# Altium integrated library vh_altium_library.intLib: 963 symbols (part 3 of 5) (continued)
## FDN5618
designator Q?
P-MOS; Reel: MAN; Supplier 1: Digi-Key; Supplier Part Number 1: FDN5618PTR-ND
footprint SOT23-GDS
pins: D, G, S

## FDS6912
designator Q?, comment FDS6912A
NMOS with Shottky diode in MicroFET 3x3mm; Supplier 1: Digi-Key; Supplier Part Number 1: FDS6912ACT-ND
footprint SO8
pins: 1, 2, 3, 4, 5, 6, 7, 8

## IRF640-TO220
designator Q?, comment IRF640
footprint TO220V-GDS
footprint TO220H-GDS
pins: D, G, S

## IRFR5505
designator Q?
P CHANNEL POWERMOS DPAK; Manufacturer: International Rectifier; Manufacturer Part Number: IRFR5505TRPBF; FET Feature: Standard; Current - Continuous Drain (Id) @ 25° C: 18A; Input Capacitance (Ciss) @ Vds: 650pF @ 25V; Gate Charge (Qg) @ Vgs: 32nC @ 10V; Drain to Source Voltage (Vdss): 55V; Power - Max: 57W; Vgs(th) (Max) @ Id: 4V @ 250µA; Rds On (Max) @ Id, Vgs: 110 mOhm @ 9.6A, 10V; FET Type: MOSFET P-Channel, Metal Oxide; Description: MOSFET P-CH 55V 18A DPAK; Supplier 1: Digi-Key; Supplier Part Number 1: IRFR5505PBFTR-ND; Mounting Type: Surface Mount; Packaging: Tape & Reel (TR); Package / Case: DPak, TO-252 (2 leads+tab), SC-63; Supplier: Digi-Key; Category: Discrete Semiconductor Products; Supplier Part Number: IRFR5505PBFTR-ND; RoHS: RoHS Compliant
footprint DPAK-GDS
pins: D, G, S

## IRLML2502
designator Q?
N CHANNEL MOSFET; Manufacturer Part Number: IRLML2502TRPBF; Manufacturer: International Rectifier; Drain to Source Voltage (Vdss): 20V; Gate Charge (Qg) @ Vgs: 12nC @ 5V; FET Feature: Logic Level Gate; Rds On (Max) @ Id, Vgs: 45 mOhm @ 4.2A, 4.5V; Vgs(th) (Max) @ Id: 1.2V @ 250µA; Current - Continuous Drain (Id) @ 25° C: 4.2A; Description: MOSFET N-CH 20V 4.2A SOT-23; Input Capacitance (Ciss) @ Vds: 740pF @ 15V; Power - Max: 1.25W; FET Type: MOSFET N-Channel, Metal Oxide; Supplier 1: Digi-Key; Supplier Part Number 1: IRLML2502PBFTR-ND; Category: Discrete Semiconductor Products; RoHS: RoHS Compliant; Mounting Type: Surface Mount; Package / Case: SOT-23-3, TO-236-3, Micro3™, SSD3, SST3; Packaging: Tape & Reel (TR); Supplier: Digi-Key; Supplier Part Number: IRLML2502PBFTR-ND
footprint SOT23-GDS
pins: D, G, S

## IRLML6401
designator Q?
N CHANNEL MOSFET; Manufacturer: International Rectifier; Manufacturer Part Number: IRLML6401TRPBF; Vgs(th) (Max) @ Id: 950mV @ 250µA; FET Feature: Logic Level Gate; Drain to Source Voltage (Vdss): 12V; Input Capacitance (Ciss) @ Vds: 830pF @ 10V; Current - Continuous Drain (Id) @ 25° C: 4.3A; Gate Charge (Qg) @ Vgs: 15nC @ 5V; FET Type: MOSFET P-Channel, Metal Oxide; Power - Max: 1.3W; Description: MOSFET P-CH 12V 4.3A SOT-23; Rds On (Max) @ Id, Vgs: 50 mOhm @ 4.3A, 4.5V; Reel: Q13; Supplier 1: Digi-Key; Supplier Part Number 1: IRLML6401PBFTR-ND; RoHS: RoHS Compliant; Packaging: Tape & Reel (TR); Supplier: Digi-Key; Supplier Part Number: IRLML6401PBFTR-ND; Mounting Type: Surface Mount; Category: Discrete Semiconductor Products; Package / Case: SOT-23-3, TO-236-3, Micro3™, SSD3, SST3
footprint SOT23-GDS
pins: D, G, S

## IRLML6402
designator Q?
N CHANNEL MOSFET; Manufacturer: International Rectifier; Manufacturer Part Number: IRLML6402TRPBF; Drain to Source Voltage (Vdss): 20V; Vgs(th) (Max) @ Id: 1.2V @ 250µA; Power - Max: 1.3W; FET Type: MOSFET P-Channel, Metal Oxide; Current - Continuous Drain (Id) @ 25° C: 3.7A; Description: MOSFET P-CH 20V 3.7A SOT-23; Input Capacitance (Ciss) @ Vds: 633pF @ 10V; FET Feature: Logic Level Gate; Rds On (Max) @ Id, Vgs: 65 mOhm @ 3.7A, 4.5V; Gate Charge (Qg) @ Vgs: 12nC @ 5V; REEL: Q15; Supplier 1: Digi-Key; Supplier Part Number 1: IRLML6402PBFTR-ND; Supplier Part Number: IRLML6402PBFTR-ND; Category: Discrete Semiconductor Products; RoHS: RoHS Compliant; Packaging: Tape & Reel (TR); Package / Case: SOT-23-3, TO-236-3, Micro3™, SSD3, SST3; Mounting Type: Surface Mount; Supplier: Digi-Key
footprint SOT23-GDS
pins: D, G, S

## MGSF2N02EL
designator Q?
N CHANNEL MOSFET 2N7002 SOT23; Supplier 1: Digi-Key; Supplier Part Number 1: MGSF2N02ELT1GOSCT-ND
footprint SOT23-GDS
pins: D, G, S

## MMBF4391
designator Q?
Supplier 1: Digi-Key; Supplier Part Number 1: MMBF4391LT1OSCT-ND
footprint SOT23-DSG (Footprint not found)
pins: D, G, S

## MMBF4392
designator Q?
Supplier 1: Digi-Key; Supplier 2: Digi-Key; Supplier Part Number 2: MMBF4392TR-ND
footprint SOT23-DSG (Footprint not found)
pins: D, G, S

## MMBF4393
designator Q?
Supplier 1: Digi-Key; Supplier 2: Digi-Key; Supplier Part Number 2: MMBF4393TR-ND
footprint SOT23-DSG (Footprint not found)
pins: D, G, S

## MMBT2222
designator Q?
BC847 SMALL SIGNAL NPN TRANSISTOR; Supplier 1: Digi-Key; Supplier Part Number 1: MMBT2222A-FDICT-ND
footprint SOT23-BCE
pins: B, C, E

## RFD16N05LSM
designator Q?
N CHANNEL MOSFET; Supplier 1: Digi-Key; Supplier Part Number 1: RFD16N05LSM9ACT-ND
footprint TO252AA-GDS
pins: D, G, S

## SI1023
designator Q?
DUAL P CHANNEL MOSFET
pins: 1, 2, 3, 4, 5, 6

## SI4630DY
designator Q2?
N VHANNEL MOSFET; Manufacturer Part Number: SI4630DY-T1-GE3; Manufacturer: Vishay/Siliconix; Description: MOSFET N-CH 25V 40A 8-SOIC; Supplier 1: Digi-Key; Supplier Part Number 1: SI4630DY-T1-GE3TR-ND
footprint SO8
pins: 1 S, 2 S, 3 S, 4 G, 5 D, 6 D, 7 D, 8 D

## SI5902
designator Q?
DUAL N CHANNEL MOSFET
footprint CHIPFET-1206X8 (CHIPFET 1206-8)
pins: 1 S1, 2 G1, 3 S2, 4 G2, 5 D2A, 6 D2B, 7 D1A, 8 D1B

## STF715
designator Q?
Manufacturer: STMicroelectronics; Frequency - Transition: 50MHz; Current - Collector Cutoff (Max): 1mA; Voltage - Collector Emitter Breakdown (Max): 80V; DC Current Gain (hFE) (Min) @ Ic, Vce: 40 @ 1A, 2V; Power - Max: 1.4W; Current - Collector (Ic) (Max): 1.5A; Vce Saturation (Max) @ Ib, Ic: 500mV @ 100mA, 1A; Transistor Type: NPN; Description: TRANSISTOR NPN MEDIUM PWR SOT89; Supplier 1: Digi-Key; Packaging: Tape & Reel (TR); Category: Discrete Semiconductor Products; Package / Case: SC-62, SOT-89-3, TO-243-3; RoHS: RoHS Compliant; Mounting Type: Surface Mount; Supplier: Digi-Key; Manufacturer Part Number: STF715; Supplier Part Number 1: 497-4656-2-ND; Supplier Part Number: 497-4656-2-ND
footprint SOT89-BCE
pins: B, C, E

## STF724
designator Q?
Manufacturer: STMicroelectronics; Transistor Type: NPN; Current - Collector Cutoff (Max): 100µA; Description: TRANSISTOR NPN MED POWER SOT-89; Voltage - Collector Emitter Breakdown (Max): 30V; Current - Collector (Ic) (Max): 3A; DC Current Gain (hFE) (Min) @ Ic, Vce: 100 @ 100mA, 2V; Power - Max: 1.4W; Frequency - Transition: 100MHz; Vce Saturation (Max) @ Ib, Ic: 1.1V @ 150mA, 3A; Reel: Q9; Supplier 1: Digi-Key; Supplier: Digi-Key; Manufacturer Part Number: STF724; Package / Case: SC-62, SOT-89-3, TO-243-3; Category: Discrete Semiconductor Products; Mounting Type: Surface Mount; Packaging: Tape & Reel (TR); RoHS: RoHS Compliant; Supplier Part Number 1: STF724-ND; Supplier Part Number: STF724-ND
footprint SOT89-BCE
pins: B, C, E

## STF817
designator Q?
Manufacturer Part Number: STF817A; Manufacturer: STMicroelectronics; Voltage - Collector Emitter Breakdown (Max): 80V; DC Current Gain (hFE) (Min) @ Ic, Vce: 30 @ 1A, 2V; Current - Collector (Ic) (Max): 1.5A; Vce Saturation (Max) @ Ib, Ic: 500mV @ 100mA, 1A; Current - Collector Cutoff (Max): 1mA; Transistor Type: PNP; Power - Max: 1.4W; Description: IC TRANS PWR PNP BIPO 30V SOT89; Frequency - Transition: 50MHz; Supplier 1: Digi-Key; RoHS: RoHS Compliant; Packaging: Tape & Reel (TR); Mounting Type: Surface Mount; Package / Case: SC-62, SOT-89-3, TO-243-3; Category: Discrete Semiconductor Products; Supplier: Digi-Key; Supplier Part Number 1: 497-4345-2-ND; Supplier Part Number: 497-4345-2-ND
footprint SOT89-BCE
pins: B, C, E


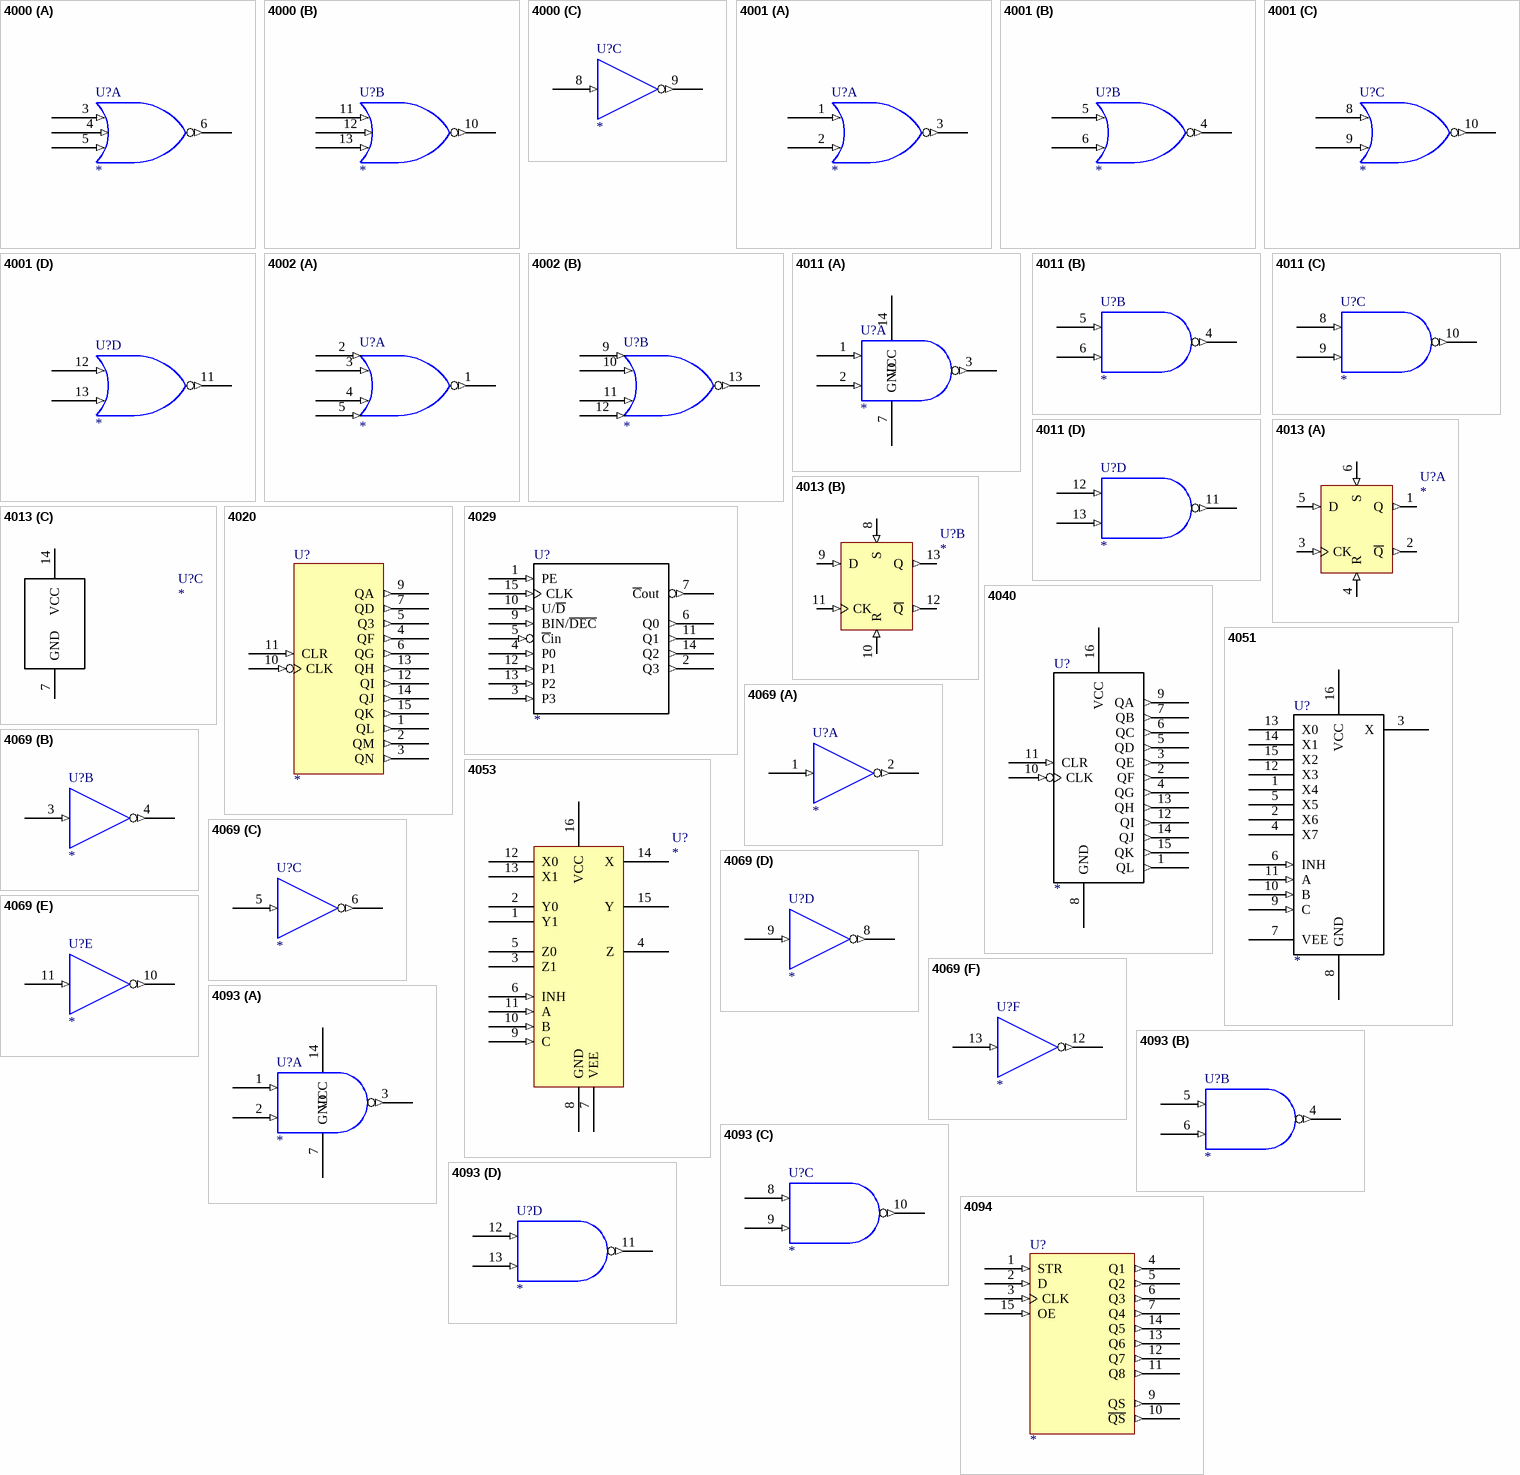
[diagram p31: symbols 4000 to 4094]

## 4000
designator U?
DUAL 3-INPUT NOR GATE PULSE INVERTER
footprint SO14
part A pins: 3 (in), 4 (in), 5 (in), 6 (out), 7 GND (power) hidden to GND, 14 VCC (power) hidden to VCC
part B pins: 10 (out), 11 (in), 12 (in), 13 (in)
part C pins: 8 (in), 9 (out)

## 4001
designator U?
Quad 2-INPUT NOR GATE
footprint SO14
part A pins: 1 (in), 2 (in), 3 (out), 7 GND (power) hidden to GND, 14 VCC (power) hidden to VCC
part B pins: 4 (out), 5 (in), 6 (in)
part C pins: 8 (in), 9 (in), 10 (out)
part D pins: 11 (out), 12 (in), 13 (in)

## 4002
designator U?
Dual 4-INPUT NOR GATE
footprint SO14
part A pins: 1 (out), 2 (in), 3 (in), 4 (in), 5 (in), 7 GND (power) hidden to GND, 14 VCC (power) hidden to VCC
part B pins: 9 (in), 10 (in), 11 (in), 12 (in), 13 (out)

## 4011
designator U?
Quad 2-INPUT Nand G
footprint SO14
part A pins: 1 (in), 2 (in), 3 (out), 7 GND (power), 14 VCC (power)
part B pins: 4 (out), 5 (in), 6 (in)
part C pins: 8 (in), 9 (in), 10 (out)
part D pins: 11 (out), 12 (in), 13 (in)

## 4013
designator U?
Dual D-Type Flip-Flop
footprint so14
part A pins: 1 Q (out), 2 ~{Q} (out), 3 CK (in), 4 R (in), 5 D (in), 6 S (in)
part B pins: 8 S (in), 9 D (in), 10 R (in), 11 CK (in), 12 ~{Q} (out), 13 Q (out)
part C pins: 7 GND, 14 VCC

## 4020
designator U?
14-BIT BINARY COUNTER
footprint SO16
pins: 1 QL (out), 2 QM (out), 3 QN (out), 4 QF (out), 5 Q3 (out), 6 QG (out), 7 QD (out), 8 GND (power) hidden to GND, 9 QA (out), 10 CLK (in), 11 CLR (in), 12 QI (out), 13 QH (out), 14 QJ (out), 15 QK (out), 16 VCC (power) hidden to VCC
1 alternate drawing of the same symbol

## 4029
designator U?
BINARY/DECADE UP/DOWN COUNTER
footprint so16
pins: 1 PE (in), 2 Q3 (out), 3 P3 (in), 4 P0 (in), 5 ~{C}in (in), 6 Q0 (out), 7 ~{C}out (out), 8 GND (power) hidden to GND, 9 BIN/~{DEC} (in), 10 U/~{D} (in), 11 Q1 (out), 12 P1 (in), 13 P2 (in), 14 Q2 (out), 15 CLK (in), 16 VCC (power) hidden to VCC
1 alternate drawing of the same symbol

## 4040
designator U?
ASYNCHRONOUS 12-BIT BINARY COUNTERS
footprint SO16
pins: 1 QL (out), 2 QF (out), 3 QE (out), 4 QG (out), 5 QD (out), 6 QC (out), 7 QB (out), 8 GND (power), 9 QA (out), 10 CLK (in), 11 CLR (in), 12 QI (out), 13 QH (out), 14 QJ (out), 15 QK (out), 16 VCC (power)
1 alternate drawing of the same symbol

## 4051
designator U?
footprint so16
pins: 1 X4, 2 X6, 3 X, 4 X7, 5 X5, 6 INH (in), 7 VEE, 8 GND (power), 9 C (in), 10 B (in), 11 A (in), 12 X3, 13 X0, 14 X1, 15 X2, 16 VCC (power)

## 4053
designator U?
footprint so16
pins: 1 Y1, 2 Y0, 3 Z1, 4 Z, 5 Z0, 6 INH (in), 7 VEE, 8 GND (power), 9 C (in), 10 B (in), 11 A (in), 12 X0, 13 X1, 14 X, 15 Y, 16 VCC (power)

## 4069
designator U?
HEX INVERTER
footprint SO14
part A pins: 1 (in), 2 (out), 7 GND (power) hidden to GND, 14 VCC (power) hidden to VCC
part B pins: 3 (in), 4 (out)
part C pins: 5 (in), 6 (out)
part D pins: 8 (out), 9 (in)
part E pins: 10 (out), 11 (in)
part F pins: 12 (out), 13 (in)

## 4093
designator U?
Quad 2-INPUT NAND SCHMITT TRIGGER
footprint SO14
part A pins: 1 (in), 2 (in), 3 (out), 7 GND (power), 14 VCC (power)
part B pins: 4 (out), 5 (in), 6 (in)
part C pins: 8 (in), 9 (in), 10 (out)
part D pins: 11 (out), 12 (in), 13 (in)

## 4094
designator U?
footprint SO16
pins: 1 STR (in), 2 D (in), 3 CLK (in), 4 Q1 (out), 5 Q2 (out), 6 Q3 (out), 7 Q4 (out), 8 GND (power) hidden to GND, 9 QS (out), 10 ~{QS} (out), 11 Q8 (out), 12 Q7 (out), 13 Q6 (out), 14 Q5 (out), 15 OE (in), 16 VCC (power) hidden to VCC


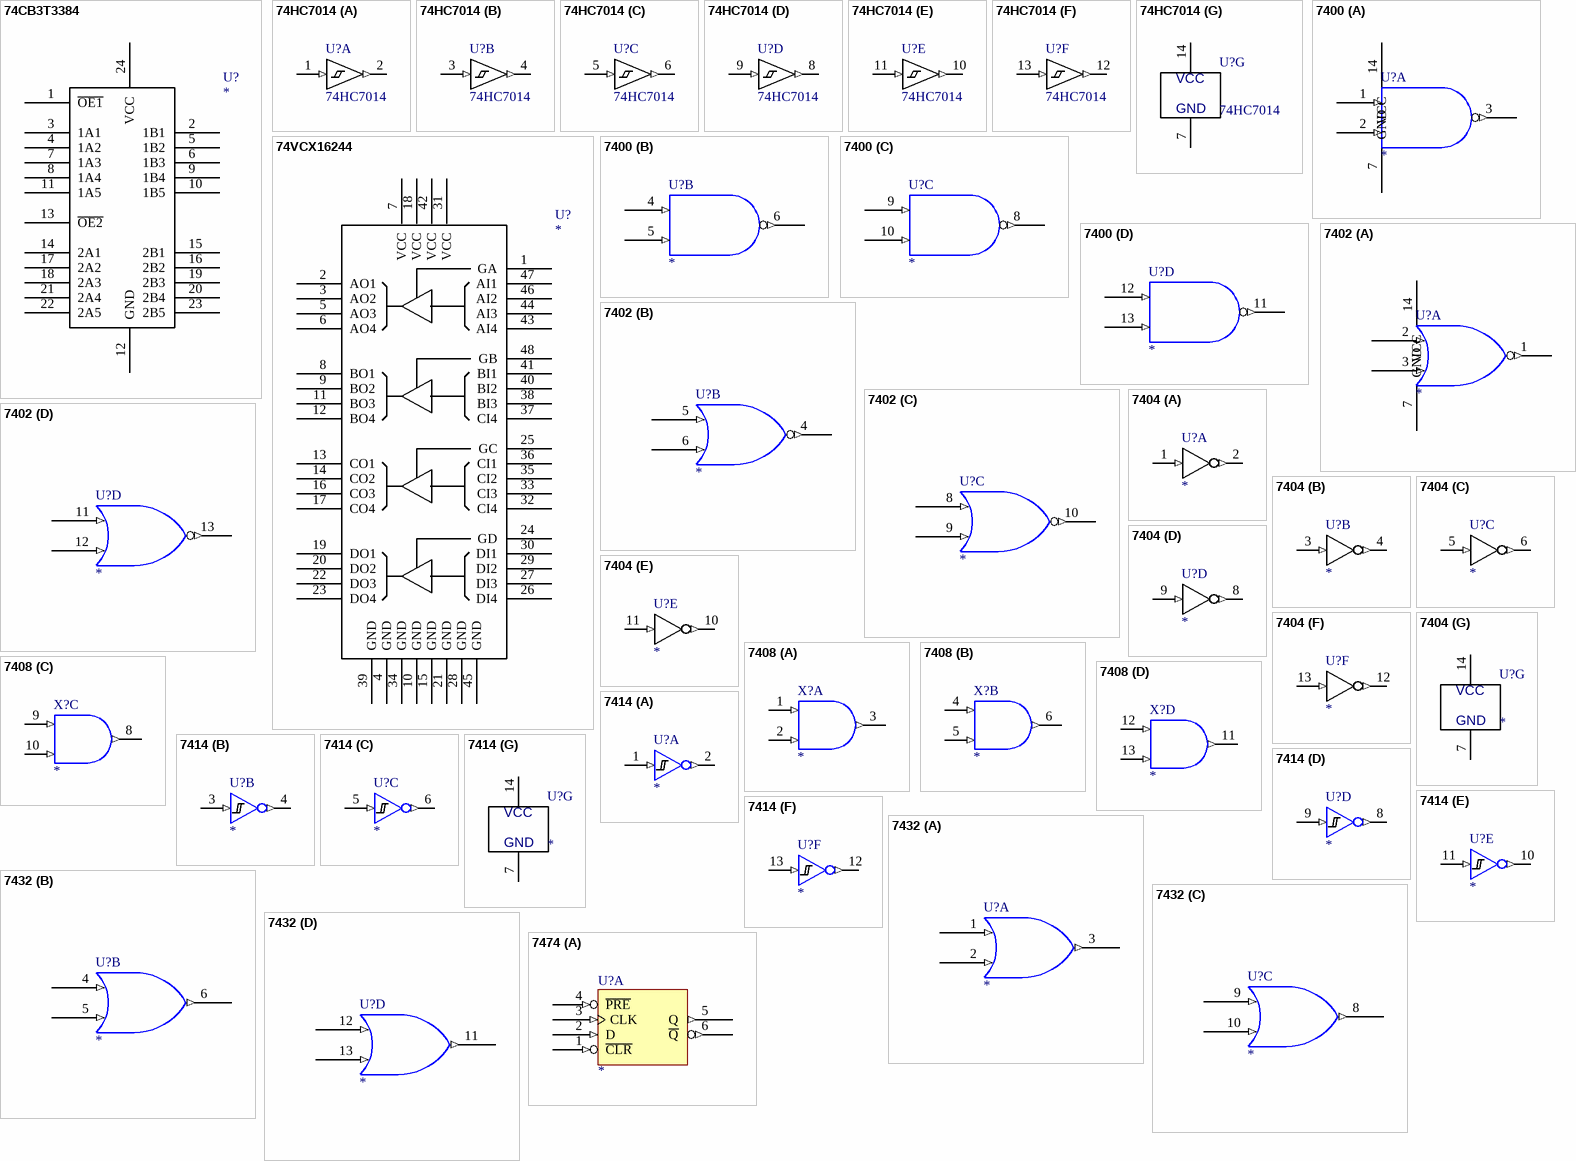
[diagram p32: symbols 74CB3T3384 to 7474]

## 74CB3T3384
designator U?
74CB3T3384 LEVEL SHIFTING BUFFER
footprint SO24W
pins: 1 ~{OE1}, 2 1B1, 3 1A1, 4 1A2, 5 1B2, 6 1B3, 7 1A3, 8 1A4, 9 1B4, 10 1B5, 11 1A5, 12 GND, 13 ~{OE2}, 14 2A1, 15 2B1, 16 2B2, 17 2A2, 18 2A3, 19 2B3, 20 2B4, 21 2A4, 22 2A5, 23 2B5, 24 VCC

## 74HC7014
designator U?
IC, Hex Schmitttrigger Buffer, SO-14
footprint SO14
part A pins: 1 A (in), 2 Y (out)
part B pins: 3 A (in), 4 Y (out)
part C pins: 5 A (in), 6 Y (out)
part D pins: 8 Y (out), 9 A (in)
part E pins: 10 Y (out), 11 A (in)
part F pins: 12 Y (out), 13 A (in)
part G pins: 7 GND, 14 VCC

## 74VCX16244
designator U?
footprint TSSOP48
pins: 1 GA, 2 AO1, 3 AO2, 4 GND, 5 AO3, 6 AO4, 7 VCC, 8 BO1, 9 BO2, 10 GND, 11 BO3, 12 BO4, 13 CO1, 14 CO2, 15 GND, 16 CO3, 17 CO4, 18 VCC, 19 DO1, 20 DO2, 21 GND, 22 DO3, 23 DO4, 24 GD, 25 GC, 26 DI4, 27 DI3, 28 GND, 29 DI2, 30 DI1, 31 VCC, 32 CI4, 33 CI3, 34 GND, 35 CI2, 36 CI1, 37 CI4, 38 BI3, 39 GND, 40 BI2, 41 BI1, 42 VCC, 43 AI4, 44 AI3, 45 GND, 46 AI2, 47 AI1, 48 GB

## 7400
designator U?
Quad 2-IN Pos Nand G
footprint SO14
part A pins: 1 (in), 2 (in), 3 (out), 7 GND (power), 14 VCC (power)
part B pins: 4 (in), 5 (in), 6 (out)
part C pins: 8 (out), 9 (in), 10 (in)
part D pins: 11 (out), 12 (in), 13 (in)

## 7402
designator U?
Quad 2-IN Pos Nor G
footprint SO14
part A pins: 1 (out), 2 (in), 3 (in), 7 GND (power), 14 VCC (power)
part B pins: 4 (out), 5 (in), 6 (in)
part C pins: 8 (in), 9 (in), 10 (out)
part D pins: 11 (in), 12 (in), 13 (out)

## 7404
designator U?
IC, M74HC04M, Hex Inverter, SO-14; Text Field1: ST; Text Field2: M74HC04M1R; Text Field3: Mouser; Text Field4: 511-M74HC04M; Text Field6: .22; Text Field5: SO-14; NI?: *; O?: *; Section:: *
footprint SO14
part A pins: 1 A (in), 2 Y (out)
part B pins: 3 A (in), 4 Y (out)
part C pins: 5 A (in), 6 Y (out)
part D pins: 8 Y (out), 9 A (in)
part E pins: 10 Y (out), 11 A (in)
part F pins: 12 Y (out), 13 A (in)
part G pins: 7 GND, 14 VCC

## 7408
designator X?
Quadruple 2-Input Positive-AND Gate
footprint SO14
part A pins: 1 A (in), 2 B (in), 3 Y (out), 7 GND (power) hidden to GND, 14 VCC (power) hidden to VCC
part B pins: 4 A (in), 5 B (in), 6 Y (out)
part C pins: 8 Y (out), 9 A (in), 10 B (in)
part D pins: 11 Y (out), 12 A (in), 13 B (in)

## 7414
designator U?
IC, M74HC04M, Hex Inverter, SO-14; Text Field1: ST; Text Field2: M74HC04M1R; Text Field3: Mouser; Text Field4: 511-M74HC04M; Text Field6: .22; Text Field5: SO-14; NI?: *; O?: *; Section:: *
footprint SO14
part A pins: 1 A (in), 2 Y (out)
part B pins: 3 A (in), 4 Y (out)
part C pins: 5 A (in), 6 Y (out)
part D pins: 8 Y (out), 9 A (in)
part E pins: 10 Y (out), 11 A (in)
part F pins: 12 Y (out), 13 A (in)
part G pins: 7 GND, 14 VCC

## 7432
designator U?
Quad 2-IN Pos Or G
footprint SO14
part A pins: 1 (in), 2 (in), 3 (out), 7 GND (power) hidden to GND, 14 VCC (power) hidden to VCC
part B pins: 4 (in), 5 (in), 6 (out)
part C pins: 8 (out), 9 (in), 10 (in)
part D pins: 11 (out), 12 (in), 13 (in)

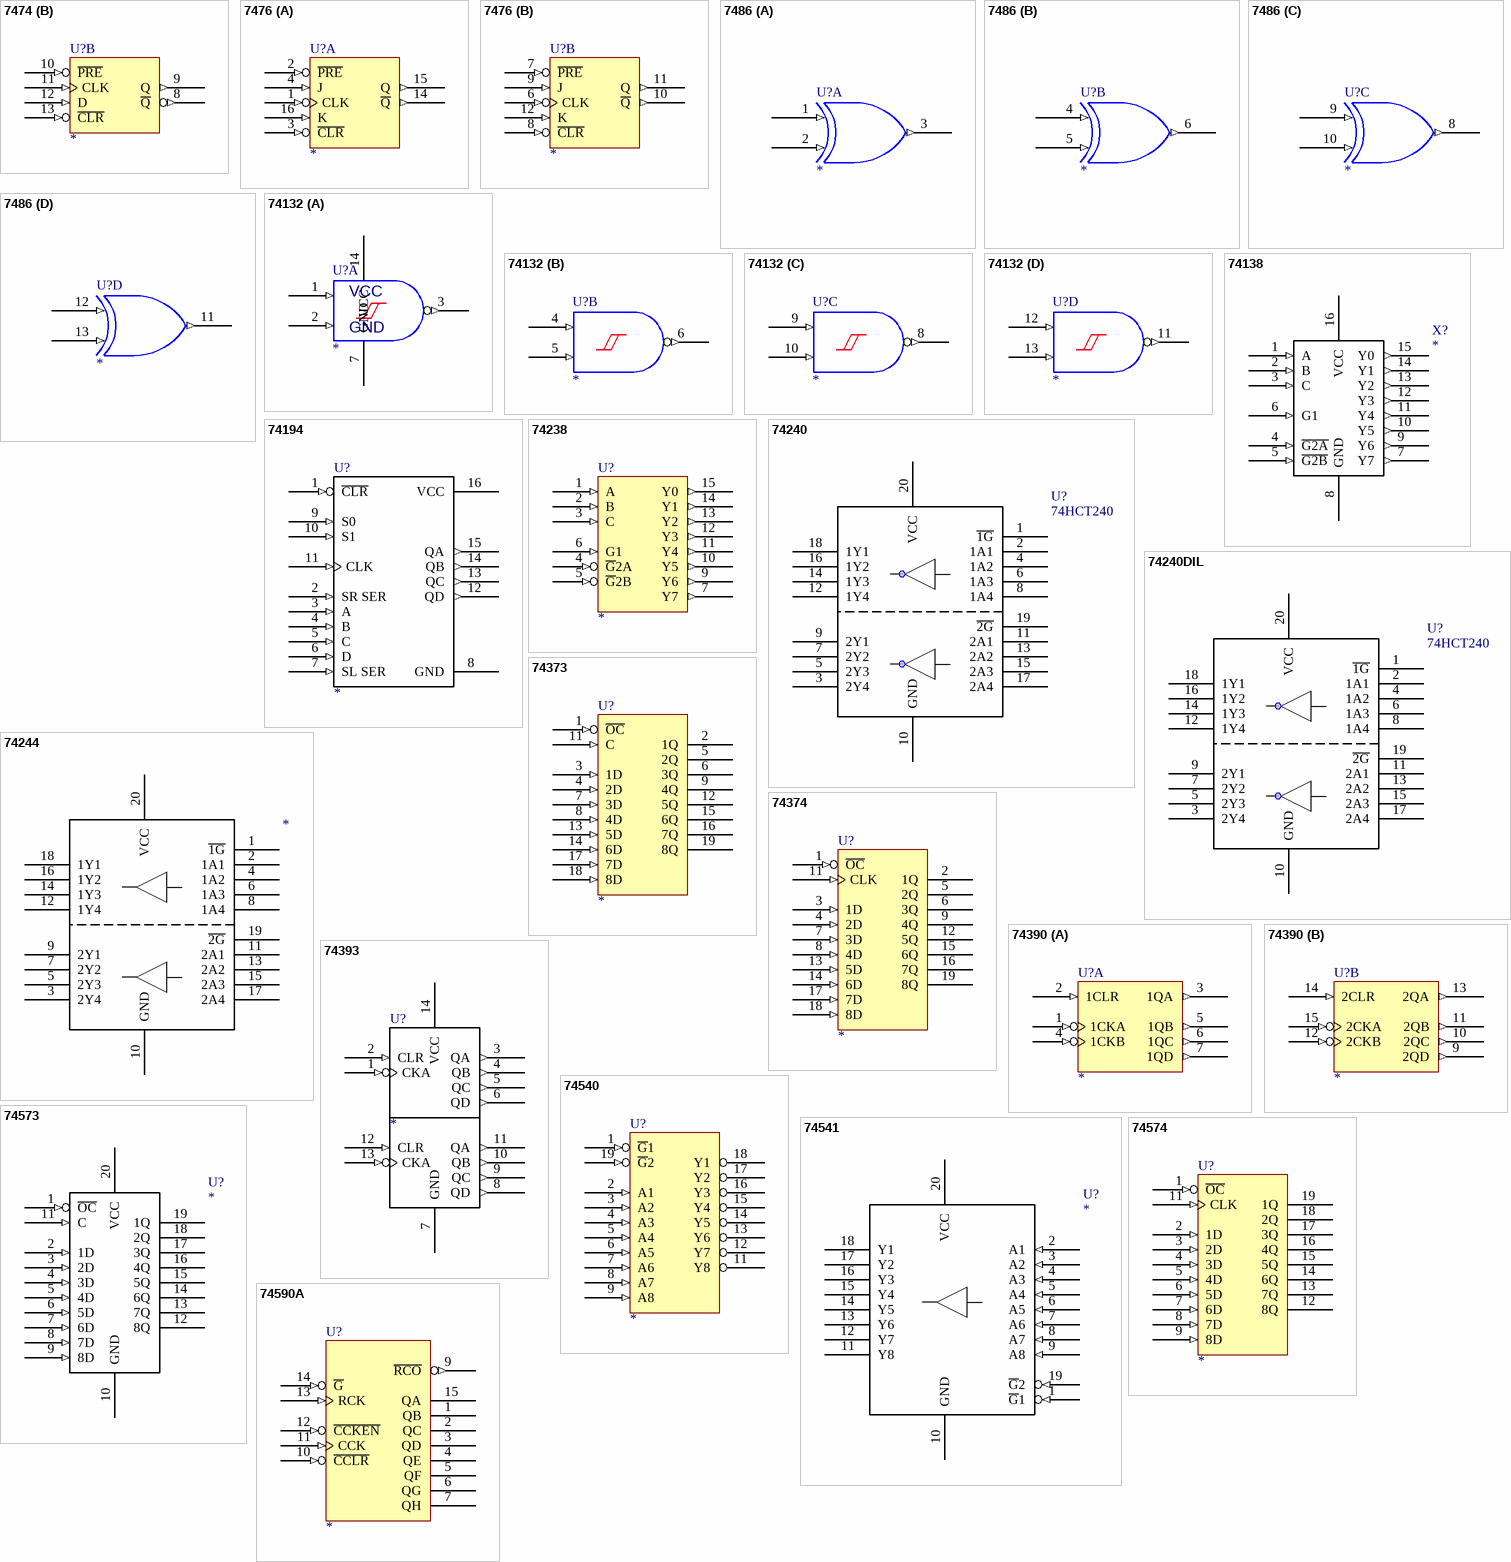
[diagram p33: symbols 7474 to 74590A]

## 7474
designator U?
DUAL D PET FF RS CR
footprint SO14
part A pins: 1 ~{CLR} (in), 2 D (in), 3 CLK (in), 4 ~{PRE} (in), 5 Q (out), 6 ~{Q} (out), 7 GND (power) hidden to GND, 14 VCC (power) hidden to VCC
part B pins: 8 ~{Q} (out), 9 Q (out), 10 ~{PRE} (in), 11 CLK (in), 12 D (in), 13 ~{CLR} (in)

## 7476
designator U?
DUAL J-K NET FF RS CR
footprint SO16
part A pins: 1 CLK (in), 2 ~{PRE} (in), 3 ~{CLR} (in), 4 J (in), 5 VCC (power) hidden to VCC, 13 GND (power) hidden to GND, 14 ~{Q} (out), 15 Q (out), 16 K (in)
part B pins: 6 CLK (in), 7 ~{PRE} (in), 8 ~{CLR} (in), 9 J (in), 10 ~{Q} (out), 11 Q (out), 12 K (in)

## 7486
designator U?
QUAD 2-IN XOR  G
footprint SO14
part A pins: 1 (in), 2 (in), 3 (out), 7 GND (power) hidden to GND, 14 VCC (power) hidden to VCC
part B pins: 4 (in), 5 (in), 6 (out)
part C pins: 8 (out), 9 (in), 10 (in)
part D pins: 11 (out), 12 (in), 13 (in)

## 74132
designator U?
QUAD 2-IN POS NAND SCH
footprint SO14
part A pins: 1 (in), 2 (in), 3 (out), 7 GND (power), 14 VCC (power)
part B pins: 4 (in), 5 (in), 6 (out)
part C pins: 8 (out), 9 (in), 10 (in)
part D pins: 11 (out), 12 (in), 13 (in)

## 74138
designator X?
3-Line to 8-Line Decoders/Demultiplexers
footprint SO16
pins: 1 A (in), 2 B (in), 3 C (in), 4 ~{G2A} (in), 5 ~{G2B} (in), 6 G1 (in), 7 Y7 (out), 8 GND (power), 9 Y6 (out), 10 Y5 (out), 11 Y4 (out), 12 Y3 (out), 13 Y2 (out), 14 Y1 (out), 15 Y0 (out), 16 VCC (power)

## 74194
designator U?
4-BIT BIDIRECTIONAL UNIVERSAL SFT REG
footprint SO16
pins: 1 ~{CLR} (in), 2 SR SER (in), 3 A (in), 4 B (in), 5 C (in), 6 D (in), 7 SL SER (in), 8 GND (power), 9 S0 (in), 10 S1 (in), 11 CLK (in), 12 QD (out), 13 QC (out), 14 QB (out), 15 QA (out), 16 VCC (power)
1 alternate drawing of the same symbol

## 74238
designator U?
3-8LINE DEC/DEMUL
footprint SO16
pins: 1 A (in), 2 B (in), 3 C (in), 4 ~{G}2A (in), 5 ~{G}2B (in), 6 G1 (in), 7 Y7 (out), 8 GND (power) hidden to GND, 9 Y6 (out), 10 Y5 (out), 11 Y4 (out), 12 Y3 (out), 13 Y2 (out), 14 Y1 (out), 15 Y0 (out), 16 VCC (power) hidden to VCC
1 alternate drawing of the same symbol

## 74240
designator U?, comment 74HCT240
74240
footprint SO20W
pins: 1 ~{1G}, 2 1A1, 3 2Y4, 4 1A2, 5 2Y3, 6 1A3, 7 2Y2, 8 1A4, 9 2Y1, 10 GND, 11 2A1, 12 1Y4, 13 2A2, 14 1Y3, 15 2A3, 16 1Y2, 17 2A4, 18 1Y1, 19 ~{2G}, 20 VCC

## 74240DIL
designator U?, comment 74HCT240
74240
footprint DIP20
pins: 1 ~{1G}, 2 1A1, 3 2Y4, 4 1A2, 5 2Y3, 6 1A3, 7 2Y2, 8 1A4, 9 2Y1, 10 GND, 11 2A1, 12 1Y4, 13 2A2, 14 1Y3, 15 2A3, 16 1Y2, 17 2A4, 18 1Y1, 19 ~{2G}, 20 VCC

## 74244
designator ?
footprint SO20W
pins: 1 ~{1G}, 2 1A1, 3 2Y4, 4 1A2, 5 2Y3, 6 1A3, 7 2Y2, 8 1A4, 9 2Y1, 10 GND, 11 2A1, 12 1Y4, 13 2A2, 14 1Y3, 15 2A3, 16 1Y2, 17 2A4, 18 1Y1, 19 ~{2G}, 20 VCC

## 74373
designator U?
OCTAL TRANSPARENT LCH
footprint SO20W
pins: 1 ~{OC} (in), 2 1Q (hiz), 3 1D (in), 4 2D (in), 5 2Q (hiz), 6 3Q (hiz), 7 3D (in), 8 4D (in), 9 4Q (hiz), 10 GND (power) hidden to GND, 11 C (in), 12 5Q (hiz), 13 5D (in), 14 6D (in), 15 6Q (hiz), 16 7Q (hiz), 17 7D (in), 18 8D (in), 19 8Q (hiz), 20 VCC (power) hidden to VCC
1 alternate drawing of the same symbol

## 74374
designator U?
OCTAL  D-TYPE EDGE-TRIGGERED FF 3SO
footprint SO20W
pins: 1 ~{OC} (in), 2 1Q (hiz), 3 1D (in), 4 2D (in), 5 2Q (hiz), 6 3Q (hiz), 7 3D (in), 8 4D (in), 9 4Q (hiz), 10 GND (power) hidden to GND, 11 CLK (in), 12 5Q (hiz), 13 5D (in), 14 6D (in), 15 6Q (hiz), 16 7Q (hiz), 17 7D (in), 18 8D (in), 19 8Q (hiz), 20 VCC (power) hidden to VCC
1 alternate drawing of the same symbol

## 74390
designator U?
DUAL 4-BIT AND BIN CNT
footprint SO16
part A pins: 1 1CKA (in), 2 1CLR (in), 3 1QA (out), 4 1CKB (in), 5 1QB (out), 6 1QC (out), 7 1QD (out), 8 GND (power) hidden to GND, 16 VCC (power) hidden to VCC
part B pins: 9 2QD (out), 10 2QC (out), 11 2QB (out), 12 2CKB (in), 13 2QA (out), 14 2CLR (in), 15 2CKA (in)

## 74393
designator U?
DUAL 4-BIT AND BIN CNT
footprint SO14
pins: 1 CKA (in), 2 CLR (in), 3 QA (out), 4 QB (out), 5 QC (out), 6 QD (out), 7 GND (power), 8 QD (out), 9 QC (out), 10 QB (out), 11 QA (out), 12 CLR (in), 13 CKA (in), 14 VCC (power)

## 74540
designator U?
OCTAL BUF AND LINE DRV 3SO
footprint SO20W
pins: 1 ~{G}1 (in), 2 A1 (in), 3 A2 (in), 4 A3 (in), 5 A4 (in), 6 A5 (in), 7 A6 (in), 8 A7 (in), 9 A8 (in), 10 GND (power) hidden to GND, 11 Y8 (hiz), 12 Y7 (hiz), 13 Y6 (hiz), 14 Y5 (hiz), 15 Y4 (hiz), 16 Y3 (hiz), 17 Y2 (hiz), 18 Y1 (hiz), 19 ~{G}2 (in), 20 VCC (power) hidden to VCC
1 alternate drawing of the same symbol

## 74541
designator U?
OCTAL BUF AND LINE DRV 3SO
footprint SO20W
pins: 1 ~{G}1 (in), 2 A1 (in), 3 A2 (in), 4 A3 (in), 5 A4 (in), 6 A5 (in), 7 A6 (in), 8 A7 (in), 9 A8 (in), 10 GND, 11 Y8 (hiz), 12 Y7 (hiz), 13 Y6 (hiz), 14 Y5 (hiz), 15 Y4 (hiz), 16 Y3 (hiz), 17 Y2 (hiz), 18 Y1 (hiz), 19 ~{G}2 (in), 20 VCC
1 alternate drawing of the same symbol

## 74573
designator U?
OCTAL D-TYPE TRANSPARENT LCH 3SO
footprint SO20W
pins: 1 ~{OC} (in), 2 1D (in), 3 2D (in), 4 3D (in), 5 4D (in), 6 5D (in), 7 6D (in), 8 7D (in), 9 8D (in), 10 GND (power), 11 C (in), 12 8Q (hiz), 13 7Q (hiz), 14 6Q (hiz), 15 5Q (hiz), 16 4Q (hiz), 17 3Q (hiz), 18 2Q (hiz), 19 1Q (hiz), 20 VCC (power)
1 alternate drawing of the same symbol

## 74574
designator U?
OCTAL D-TYPE EDGE-TRIGGERED FF 3SO
footprint SO20W
pins: 1 ~{OC} (in), 2 1D (in), 3 2D (in), 4 3D (in), 5 4D (in), 6 5D (in), 7 6D (in), 8 7D (in), 9 8D (in), 10 GND (power) hidden to GND, 11 CLK (in), 12 8Q (hiz), 13 7Q (hiz), 14 6Q (hiz), 15 5Q (hiz), 16 4Q (hiz), 17 3Q (hiz), 18 2Q (hiz), 19 1Q (hiz), 20 VCC (power) hidden to VCC
1 alternate drawing of the same symbol
